# Altium footprint library Cap.PcbLib: 102 footprints (part 4 of 7)
Each footprint in its own frame and in the unit in brackets; x right, y up, seen from the top. Pads: shape width x height; smd on the part's side, far side on the other; paste and mask are expansions set on the pad; w line width, h text height; cw(c..) or ccw(c..) is an arc to the next point about the centre after c.
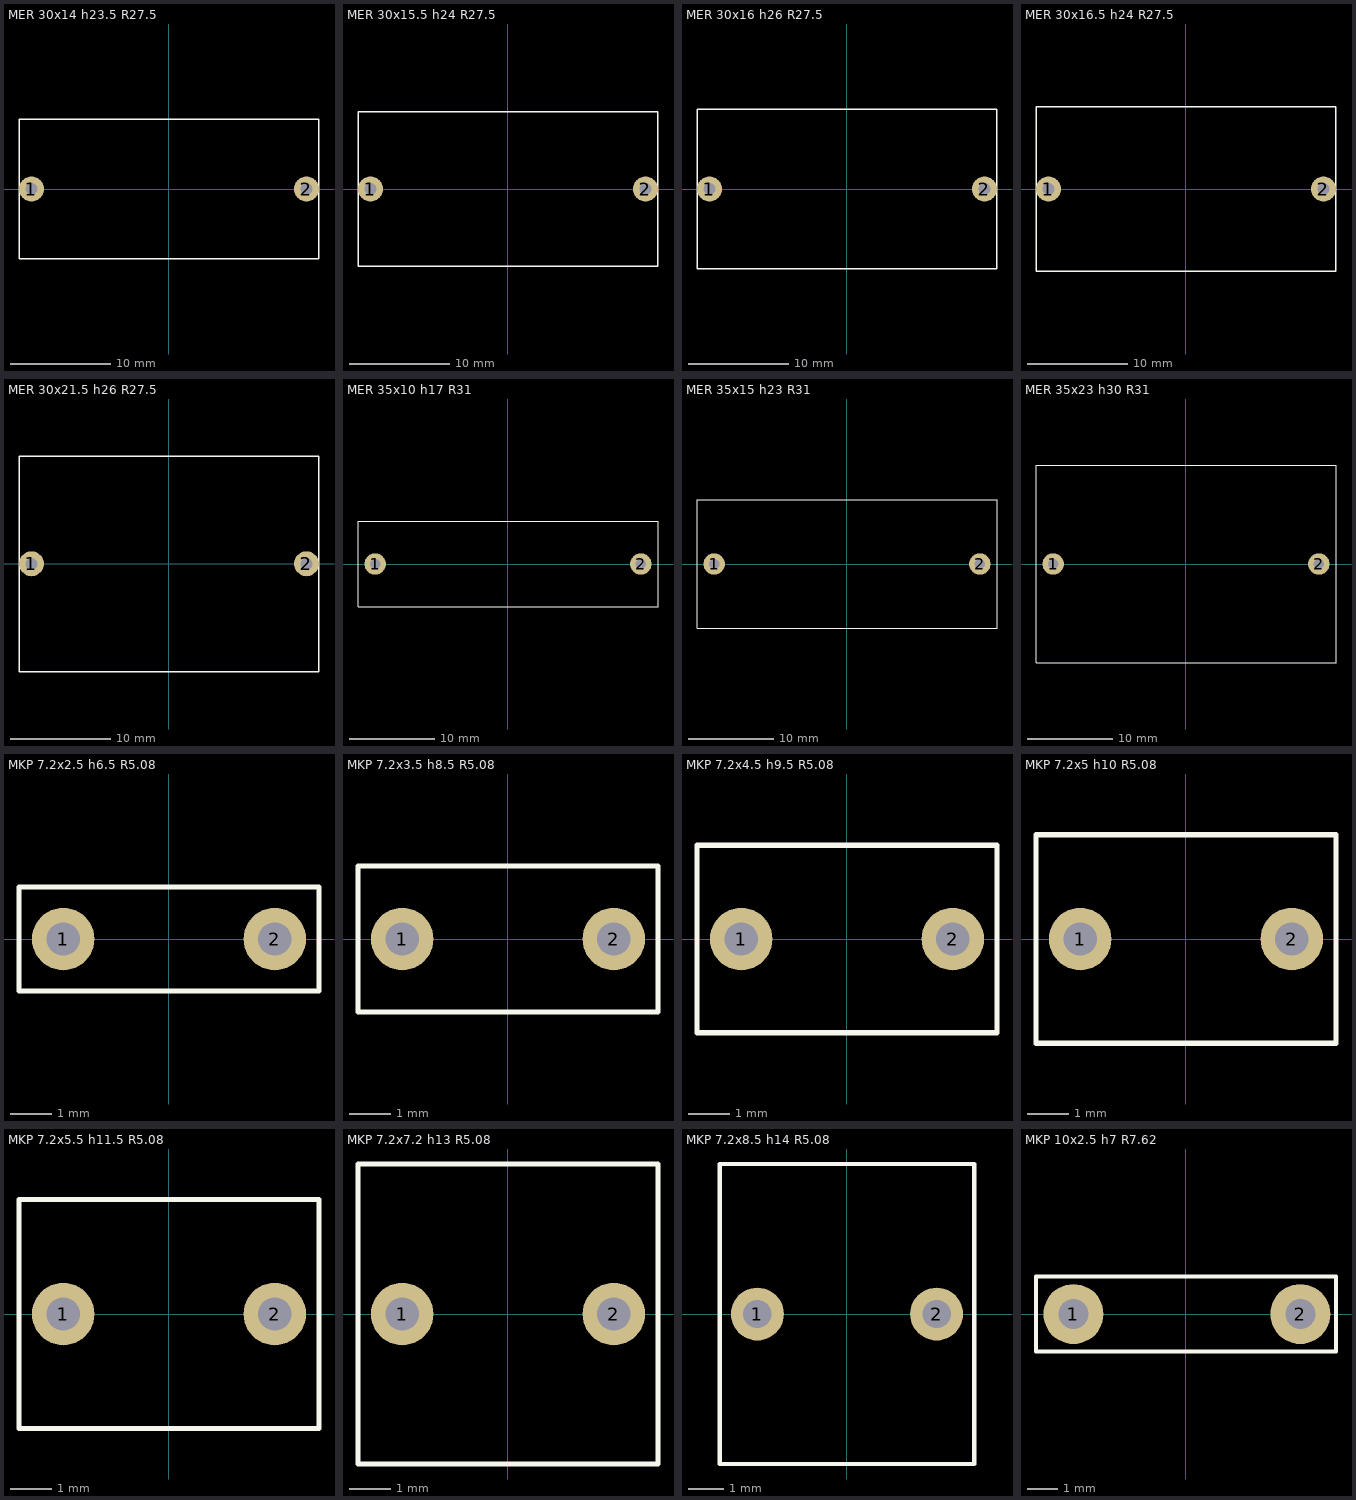
[diagram p3: the footprints below, top view; thin cyan lines are the x and y axes]

## MER 30x14 h23.5 R27.5 [mm]
pads (2):
  round 2.5 hole 1.2: 1(-13.75,0) 2(13.75,0)
TopOverlay:
  lines w0.127: -15,-7 15,-7 15,7 -15,7 -15,-7
3D body: height 24.5, standoff -2, extent -15,-7 15,7

## MER 30x15.5 h24 R27.5 [mm]
pads (2):
  round 2.5 hole 1.2: 1(-13.75,0) 2(13.75,0)
TopOverlay:
  lines w0.127: -15,-7.75 -15,7.75 15,7.75 15,-7.75 -15,-7.75
3D body: height 25, standoff -2, extent -15,-7.75 15,7.75

## MER 30x16 h26 R27.5 [mm]
pads (2):
  round 2.5 hole 1.2: 1(-13.75,0) 2(13.75,0)
TopOverlay:
  lines w0.127: -15,-8 15,-8 15,8 -15,8 -15,-8
3D body: height 27, standoff -2, extent -15,-8 15,8

## MER 30x16.5 h24 R27.5 [mm]
pads (2):
  round 2.5 hole 1.2: 1(-13.75,0) 2(13.75,0)
TopOverlay:
  lines w0.127: -15,-8.25 -15,8.25 15,8.25 15,-8.25 -15,-8.25
3D body: height 25, standoff -2, extent -15,-8.25 15,8.25

## MER 30x21.5 h26 R27.5 [mm]
pads (2):
  round 2.5 hole 1.2: 1(-13.75,0) 2(13.75,0)
TopOverlay:
  lines w0.127: -15,-10.795 -15,10.75 15,10.75 15,-10.795 -15,-10.795
3D body: height 27, standoff -2, extent -15,-10.75 15,10.75

## MER 35x10 h17 R31 [mm]
pads (2):
  round 2.5 hole 1.2: 1(-15.5,0) 2(15.5,0)
TopOverlay:
  lines w0.127: -17.5,-5 17.5,-5 17.5,5 -17.5,5 -17.5,-5
3D body: height 18, standoff -2, extent -17.5,-5 17.5,5

## MER 35x15 h23 R31 [mm]
pads (2):
  round 2.5 hole 1.2: 1(-15.5,0) 2(15.5,0)
TopOverlay:
  lines w0.127: -17.5,-7.5 17.5,-7.5 17.5,7.5 -17.5,7.5 -17.5,-7.5
3D body: height 24, standoff -2, extent -17.5,-7.5 17.5,7.5

## MER 35x23 h30 R31 [mm]
pads (2):
  round 2.5 hole 1.2: 1(-15.5,0) 2(15.5,0)
TopOverlay:
  lines w0.127: -17.5,-11.5 17.5,-11.5 17.5,11.5 -17.5,11.5 -17.5,-11.5
3D body: height 31, standoff -2, extent -17.5,-11.5 17.5,11.5

## MKP 7.2x2.5 h6.5 R5.08 [mm]
pads (2):
  round 1.5 hole 0.8: 1(-2.54,0) 2(2.54,0)
TopOverlay:
  lines w0.127: -3.6,-1.25 3.6,-1.25 3.6,1.25 -3.6,1.25 -3.6,-1.25
3D body: height 6.5, standoff -2.54, extent -3.6,-1.25 3.6,1.25

## MKP 7.2x3.5 h8.5 R5.08 [mm]
pads (2):
  round 1.5 hole 0.8: 1(-2.54,0) 2(2.54,0)
TopOverlay:
  lines w0.127: -3.6,-1.75 3.6,-1.75 3.6,1.75 -3.6,1.75 -3.6,-1.75
3D body: height 8.5, standoff -2.54, extent -3.6,-1.75 3.6,1.75

## MKP 7.2x4.5 h9.5 R5.08 [mm]
pads (2):
  round 1.5 hole 0.8: 1(-2.54,0) 2(2.54,0)
TopOverlay:
  lines w0.127: -3.6,-2.25 -3.6,2.25 3.6,2.25 3.6,-2.25 -3.6,-2.25
3D body: height 9.5, standoff -2.54, extent -3.6,-2.25 3.6,2.25

## MKP 7.2x5 h10 R5.08 [mm]
pads (2):
  round 1.5 hole 0.8: 1(-2.54,0) 2(2.54,0)
TopOverlay:
  lines w0.127: -3.6,-2.5 -3.6,2.5 3.6,2.5 3.6,-2.5 -3.6,-2.5
3D body: height 10, standoff -2.54, extent -3.6,-2.5 3.6,2.5

## MKP 7.2x5.5 h11.5 R5.08 [mm]
pads (2):
  round 1.5 hole 0.8: 1(-2.54,0) 2(2.54,0)
TopOverlay:
  lines w0.127: -3.6,-2.75 3.6,-2.75 3.6,2.75 -3.6,2.75 -3.6,-2.75
3D body: height 11.5, standoff -2.54, extent -3.6,-2.75 3.6,2.75

## MKP 7.2x7.2 h13 R5.08 [mm]
pads (2):
  round 1.5 hole 0.8: 1(-2.54,0) 2(2.54,0)
TopOverlay:
  lines w0.127: -3.6,-3.6 -3.6,3.6 3.6,3.6 3.6,-3.6 -3.6,-3.6
3D body: height 13, standoff -2.54, extent -3.6,-3.6 3.6,3.6

## MKP 7.2x8.5 h14 R5.08 [mm]
pads (2):
  round 1.5 hole 0.8: 1(-2.54,0) 2(2.54,0)
TopOverlay:
  lines w0.127: -3.6,-4.25 -3.6,4.25 3.6,4.25 3.6,-4.25 -3.6,-4.25
3D body: height 14, standoff -2.54, extent -3.6,-4.25 3.6,4.25

## MKP 10x2.5 h7 R7.62 [mm]
pads (2):
  round 2 hole 1: 1(-3.75,0) 2(3.81,0)
TopOverlay:
  lines w0.127: -5,-1.25 5,-1.25 5,1.25 -5,1.25 -5,-1.25
3D body: height 7, standoff -2.54, extent -5,-1.25 5,1.25